# Altium footprint library Connectors.PcbLib: 268 footprints (part 7 of 21)
Each footprint in its own frame and in the unit in brackets; x right, y up, seen from the top. Pads: shape width x height; smd on the part's side, far side on the other; paste and mask are expansions set on the pad; w line width, h text height; cw(c..) or ccw(c..) is an arc to the next point about the centre after c.
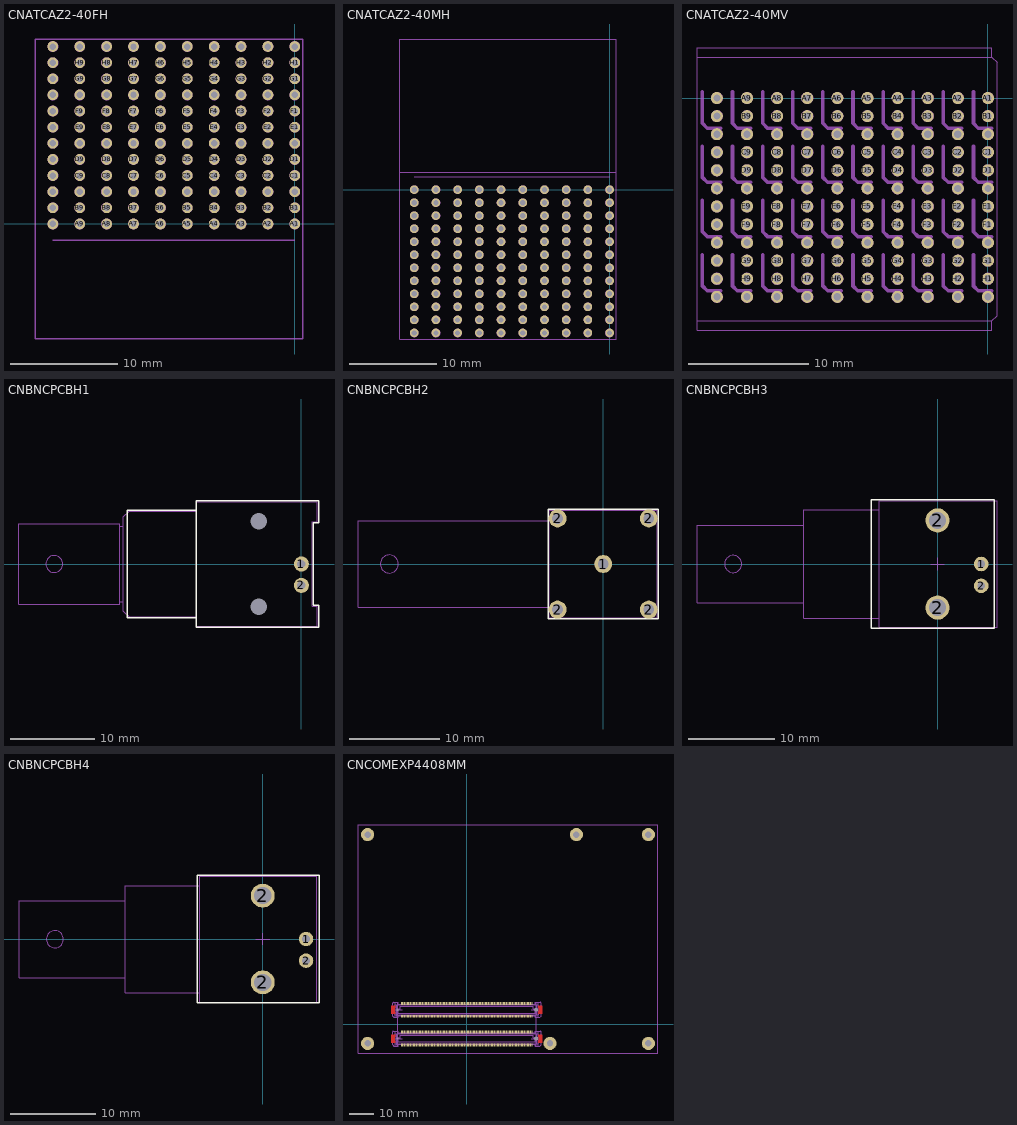
[diagram p6: the footprints below, top view; thin cyan lines are the x and y axes]

## CNATCAZ2-40FH [mm] "ATCA Zone 2 40 shielded pairs female horizontal daughterboard"
pads (120):
  round 1 hole 0.6: A1(0,0) A2(-2.5,0) A3(-5,0) A4(-7.5,0) A5(-10,0) A6(-12.5,0) A7(-15,0) A8(-17.5,0) A9(-20,0) A10(-22.5,0) B1(0,1.5) B2(-2.5,1.5) B3(-5,1.5) B4(-7.5,1.5) B5(-10,1.5) B6(-12.5,1.5) B7(-15,1.5) B8(-17.5,1.5) B9(-20,1.5) B10(-22.5,1.5) BG1(0,3) BG2(-2.5,3) BG3(-5,3) BG4(-7.5,3) BG5(-10,3) BG6(-12.5,3) BG7(-15,3) BG8(-17.5,3) BG9(-20,3) BG10(-22.5,3) C1(0,4.5) C2(-2.5,4.5) C3(-5,4.5) C4(-7.5,4.5) C5(-10,4.5) C6(-12.5,4.5) C7(-15,4.5) C8(-17.5,4.5) C9(-20,4.5) C10(-22.5,4.5) D1(0,6) D2(-2.5,6) D3(-5,6) D4(-7.5,6) D5(-10,6) D6(-12.5,6) D7(-15,6) D8(-17.5,6) D9(-20,6) D10(-22.5,6) DG1(0,7.5) DG2(-2.5,7.5) DG3(-5,7.5) DG4(-7.5,7.5) DG5(-10,7.5) DG6(-12.5,7.5) DG7(-15,7.5) DG8(-17.5,7.5) DG9(-20,7.5) DG10(-22.5,7.5) E1(0,9) E2(-2.5,9) E3(-5,9) E4(-7.5,9) E5(-10,9) E6(-12.5,9) E7(-15,9) E8(-17.5,9) E9(-20,9) E10(-22.5,9) F1(0,10.5) F2(-2.5,10.5) F3(-5,10.5) F4(-7.5,10.5) F5(-10,10.5) F6(-12.5,10.5) F7(-15,10.5) F8(-17.5,10.5) F9(-20,10.5) F10(-22.5,10.5) FG1(0,12) FG2(-2.5,12) FG3(-5,12) FG4(-7.5,12) FG5(-10,12) FG6(-12.5,12) FG7(-15,12) FG8(-17.5,12) FG9(-20,12) FG10(-22.5,12) G1(0,13.5) G2(-2.5,13.5) G3(-5,13.5) G4(-7.5,13.5) G5(-10,13.5) G6(-12.5,13.5) G7(-15,13.5) G8(-17.5,13.5) G9(-20,13.5) G10(-22.5,13.5) H1(0,15) H2(-2.5,15) H3(-5,15) H4(-7.5,15) H5(-10,15) H6(-12.5,15) H7(-15,15) H8(-17.5,15) H9(-20,15) H10(-22.5,15) HG1(0,16.5) HG2(-2.5,16.5) HG3(-5,16.5) HG4(-7.5,16.5) HG5(-10,16.5) HG6(-12.5,16.5) HG7(-15,16.5) HG8(-17.5,16.5) HG9(-20,16.5) HG10(-22.5,16.5)
Mechanical 13:
  lines w0.127: -24.15,-10.7 0.75,-10.7 0.75,17.2 -24.15,17.2 -24.15,-10.7
Mechanical 15:
  lines w0.127: -22.5,-1.5 0,-1.5
  text "DAUGHTER BOARD" at -16.7,-1.2 h0.8
Mechanical 16:
  circle w1: c-22.5,0 r0.001
  circle w1: c0,0 r0.001
  circle w1: c-10,0 r0.001
  circle w1: c-7.5,0 r0.001
  circle w1: c-5,0 r0.001
  circle w1: c-2.5,0 r0.001
  circle w1: c-12.5,0 r0.001
  circle w1: c-15,0 r0.001
  circle w1: c-17.5,0 r0.001
  circle w1: c-20,0 r0.001
  circle w1: c-22.5,1.5 r0.001
  circle w1: c0,1.5 r0.001
  circle w1: c-10,1.5 r0.001
  circle w1: c-7.5,1.5 r0.001
  circle w1: c-5,1.5 r0.001
  circle w1: c-2.5,1.5 r0.001
  circle w1: c-12.5,1.5 r0.001
  circle w1: c-15,1.5 r0.001
  circle w1: c-17.5,1.5 r0.001
  circle w1: c-20,1.5 r0.001
  circle w1: c-22.5,3 r0.001
  circle w1: c0,3 r0.001
  circle w1: c-10,3 r0.001
  circle w1: c-7.5,3 r0.001
  circle w1: c-5,3 r0.001
  circle w1: c-2.5,3 r0.001
  circle w1: c-12.5,3 r0.001
  circle w1: c-15,3 r0.001
  circle w1: c-17.5,3 r0.001
  circle w1: c-20,3 r0.001
  circle w1: c-22.5,4.5 r0.001
  circle w1: c0,4.5 r0.001
  circle w1: c-10,4.5 r0.001
  circle w1: c-7.5,4.5 r0.001
  circle w1: c-5,4.5 r0.001
  circle w1: c-2.5,4.5 r0.001
  circle w1: c-12.5,4.5 r0.001
  circle w1: c-15,4.5 r0.001
  circle w1: c-17.5,4.5 r0.001
  circle w1: c-20,4.5 r0.001
  circle w1: c-22.5,6 r0.001
  circle w1: c0,6 r0.001
  circle w1: c-10,6 r0.001
  circle w1: c-7.5,6 r0.001
  circle w1: c-5,6 r0.001
  circle w1: c-2.5,6 r0.001
  circle w1: c-12.5,6 r0.001
  circle w1: c-15,6 r0.001
  circle w1: c-17.5,6 r0.001
  circle w1: c-20,6 r0.001
  circle w1: c-22.5,7.5 r0.001
  circle w1: c0,7.5 r0.001
  circle w1: c-10,7.5 r0.001
  circle w1: c-7.5,7.5 r0.001
  circle w1: c-5,7.5 r0.001
  circle w1: c-2.5,7.5 r0.001
  circle w1: c-12.5,7.5 r0.001
  circle w1: c-15,7.5 r0.001
  circle w1: c-17.5,7.5 r0.001
  circle w1: c-20,7.5 r0.001
  circle w1: c-22.5,9 r0.001
  circle w1: c0,9 r0.001
  circle w1: c-10,9 r0.001
  circle w1: c-7.5,9 r0.001
  circle w1: c-5,9 r0.001
  circle w1: c-2.5,9 r0.001
  circle w1: c-12.5,9 r0.001
  circle w1: c-15,9 r0.001
  circle w1: c-17.5,9 r0.001
  circle w1: c-20,9 r0.001
  circle w1: c-22.5,10.5 r0.001
  circle w1: c0,10.5 r0.001
  circle w1: c-10,10.5 r0.001
  circle w1: c-7.5,10.5 r0.001
  circle w1: c-5,10.5 r0.001
  circle w1: c-2.5,10.5 r0.001
  circle w1: c-12.5,10.5 r0.001
  circle w1: c-15,10.5 r0.001
  circle w1: c-17.5,10.5 r0.001
  circle w1: c-20,10.5 r0.001
  circle w1: c-22.5,12 r0.001
  circle w1: c0,12 r0.001
  circle w1: c-10,12 r0.001
  circle w1: c-7.5,12 r0.001
  circle w1: c-5,12 r0.001
  circle w1: c-2.5,12 r0.001
  circle w1: c-12.5,12 r0.001
  circle w1: c-15,12 r0.001
  circle w1: c-17.5,12 r0.001
  circle w1: c-20,12 r0.001
  circle w1: c-22.5,13.5 r0.001
  circle w1: c0,13.5 r0.001
  circle w1: c-10,13.5 r0.001
  circle w1: c-7.5,13.5 r0.001
  circle w1: c-5,13.5 r0.001
  circle w1: c-2.5,13.5 r0.001
  circle w1: c-12.5,13.5 r0.001
  circle w1: c-15,13.5 r0.001
  circle w1: c-17.5,13.5 r0.001
  circle w1: c-20,13.5 r0.001
  circle w1: c-20,15 r0.001
  circle w1: c-17.5,15 r0.001
  circle w1: c-15,15 r0.001
  circle w1: c-12.5,15 r0.001
  circle w1: c-2.5,15 r0.001
  circle w1: c-5,15 r0.001
  circle w1: c-7.5,15 r0.001
  circle w1: c-10,15 r0.001
  circle w1: c0,15 r0.001
  circle w1: c0,16.5 r0.001
  circle w1: c-10,16.5 r0.001
  circle w1: c-7.5,16.5 r0.001
  circle w1: c-5,16.5 r0.001
  circle w1: c-2.5,16.5 r0.001
  circle w1: c-12.5,16.5 r0.001
  circle w1: c-15,16.5 r0.001
  circle w1: c-17.5,16.5 r0.001
  circle w1: c-22.5,15 r0.001
  circle w1: c-20,16.5 r0.001
  circle w1: c-22.5,16.5 r0.001
  text "Finished hole: 0.6 ± 0.05 mm" at 0.508,-1.905 h2.5
  text "Drilled hole: 0.7 ± 0.02 mm" at 0.508,-3.937 h2.5
3D body "c-6469081-01-o-3d.stp": height 12.19, standoff -4.66, extent -24.15,-10.7 0.75,13.7

## CNATCAZ2-40MH [mm] "ATCA Zone 2 40 shielded pairs male horizontal"
pads (120):
  round 1 hole 0.6: A1(0,0) A2(-2.5,0) A3(-5,0) A4(-7.5,0) A5(-10,0) A6(-12.5,0) A7(-15,0) A8(-17.5,0) A9(-20,0) A10(-22.5,0) B1(0,-1.5) B2(-2.5,-1.5) B3(-5,-1.5) B4(-7.5,-1.5) B5(-10,-1.5) B6(-12.5,-1.5) B7(-15,-1.5) B8(-17.5,-1.5) B9(-20,-1.5) B10(-22.5,-1.5) BG1(0,-3) BG2(-2.5,-3) BG3(-5,-3) BG4(-7.5,-3) BG5(-10,-3) BG6(-12.5,-3) BG7(-15,-3) BG8(-17.5,-3) BG9(-20,-3) BG10(-22.5,-3) C1(0,-4.5) C2(-2.5,-4.5) C3(-5,-4.5) C4(-7.5,-4.5) C5(-10,-4.5) C6(-12.5,-4.5) C7(-15,-4.5) C8(-17.5,-4.5) C9(-20,-4.5) C10(-22.5,-4.5) D1(0,-6) D2(-2.5,-6) D3(-5,-6) D4(-7.5,-6) D5(-10,-6) D6(-12.5,-6) D7(-15,-6) D8(-17.5,-6) D9(-20,-6) D10(-22.5,-6) DG1(0,-7.5) DG2(-2.5,-7.5) DG3(-5,-7.5) DG4(-7.5,-7.5) DG5(-10,-7.5) DG6(-12.5,-7.5) DG7(-15,-7.5) DG8(-17.5,-7.5) DG9(-20,-7.5) DG10(-22.5,-7.5) E1(0,-9) E2(-2.5,-9) E3(-5,-9) E4(-7.5,-9) E5(-10,-9) E6(-12.5,-9) E7(-15,-9) E8(-17.5,-9) E9(-20,-9) E10(-22.5,-9) F1(0,-10.5) F2(-2.5,-10.5) F3(-5,-10.5) F4(-7.5,-10.5) F5(-10,-10.5) F6(-12.5,-10.5) F7(-15,-10.5) F8(-17.5,-10.5) F9(-20,-10.5) F10(-22.5,-10.5) FG1(0,-12) FG2(-2.5,-12) FG3(-5,-12) FG4(-7.5,-12) FG5(-10,-12) FG6(-12.5,-12) FG7(-15,-12) FG8(-17.5,-12) FG9(-20,-12) FG10(-22.5,-12) G1(0,-13.5) G2(-2.5,-13.5) G3(-5,-13.5) G4(-7.5,-13.5) G5(-10,-13.5) G6(-12.5,-13.5) G7(-15,-13.5) G8(-17.5,-13.5) G9(-20,-13.5) G10(-22.5,-13.5) H1(0,-15) H2(-2.5,-15) H3(-5,-15) H4(-7.5,-15) H5(-10,-15) H6(-12.5,-15) H7(-15,-15) H8(-17.5,-15) H9(-20,-15) H10(-22.5,-15) HG1(0,-16.5) HG2(-2.5,-16.5) HG3(-5,-16.5) HG4(-7.5,-16.5) HG5(-10,-16.5) HG6(-12.5,-16.5) HG7(-15,-16.5) HG8(-17.5,-16.5) HG9(-20,-16.5) HG10(-22.5,-16.5)
Mechanical 13:
  lines w0.1: -24.15,2 0.75,2 ; 0.725,17.35 -24.15,17.35 -24.15,-17.2 0.75,-17.2 0.75,17.35
Mechanical 15:
  lines w0.1: -22.5,1.5 0,1.5
Mechanical 16:
  circle w1: c-22.5,-16.5 r0.001
  circle w1: c0,-16.5 r0.001
  circle w1: c-2.5,-16.5 r0.001
  circle w1: c-5,-16.5 r0.001
  circle w1: c-7.5,-16.5 r0.001
  circle w1: c-10,-16.5 r0.001
  circle w1: c-12.5,-16.5 r0.001
  circle w1: c-15,-16.5 r0.001
  circle w1: c-17.5,-16.5 r0.001
  circle w1: c-20,-16.5 r0.001
  circle w1: c-22.5,-15 r0.001
  circle w1: c0,-15 r0.001
  circle w1: c-2.5,-15 r0.001
  circle w1: c-5,-15 r0.001
  circle w1: c-7.5,-15 r0.001
  circle w1: c-10,-15 r0.001
  circle w1: c-12.5,-15 r0.001
  circle w1: c-15,-15 r0.001
  circle w1: c-17.5,-15 r0.001
  circle w1: c-20,-15 r0.001
  circle w1: c-22.5,-13.5 r0.001
  circle w1: c0,-13.5 r0.001
  circle w1: c-2.5,-13.5 r0.001
  circle w1: c-5,-13.5 r0.001
  circle w1: c-7.5,-13.5 r0.001
  circle w1: c-10,-13.5 r0.001
  circle w1: c-12.5,-13.5 r0.001
  circle w1: c-15,-13.5 r0.001
  circle w1: c-17.5,-13.5 r0.001
  circle w1: c-20,-13.5 r0.001
  circle w1: c-22.5,-12 r0.001
  circle w1: c0,-12 r0.001
  circle w1: c-2.5,-12 r0.001
  circle w1: c-5,-12 r0.001
  circle w1: c-7.5,-12 r0.001
  circle w1: c-10,-12 r0.001
  circle w1: c-12.5,-12 r0.001
  circle w1: c-15,-12 r0.001
  circle w1: c-17.5,-12 r0.001
  circle w1: c-20,-12 r0.001
  circle w1: c-22.5,-10.5 r0.001
  circle w1: c0,-10.5 r0.001
  circle w1: c-2.5,-10.5 r0.001
  circle w1: c-5,-10.5 r0.001
  circle w1: c-7.5,-10.5 r0.001
  circle w1: c-10,-10.5 r0.001
  circle w1: c-12.5,-10.5 r0.001
  circle w1: c-15,-10.5 r0.001
  circle w1: c-17.5,-10.5 r0.001
  circle w1: c-20,-10.5 r0.001
  circle w1: c-22.5,-9 r0.001
  circle w1: c0,-9 r0.001
  circle w1: c-2.5,-9 r0.001
  circle w1: c-5,-9 r0.001
  circle w1: c-7.5,-9 r0.001
  circle w1: c-10,-9 r0.001
  circle w1: c-12.5,-9 r0.001
  circle w1: c-15,-9 r0.001
  circle w1: c-17.5,-9 r0.001
  circle w1: c-20,-9 r0.001
  circle w1: c-22.5,-7.5 r0.001
  circle w1: c0,-7.5 r0.001
  circle w1: c-2.5,-7.5 r0.001
  circle w1: c-5,-7.5 r0.001
  circle w1: c-7.5,-7.5 r0.001
  circle w1: c-10,-7.5 r0.001
  circle w1: c-12.5,-7.5 r0.001
  circle w1: c-15,-7.5 r0.001
  circle w1: c-17.5,-7.5 r0.001
  circle w1: c-20,-7.5 r0.001
  circle w1: c-22.5,-6 r0.001
  circle w1: c0,-6 r0.001
  circle w1: c-2.5,-6 r0.001
  circle w1: c-5,-6 r0.001
  circle w1: c-7.5,-6 r0.001
  circle w1: c-10,-6 r0.001
  circle w1: c-12.5,-6 r0.001
  circle w1: c-15,-6 r0.001
  circle w1: c-17.5,-6 r0.001
  circle w1: c-20,-6 r0.001
  circle w1: c-22.5,-4.5 r0.001
  circle w1: c0,-4.5 r0.001
  circle w1: c-2.5,-4.5 r0.001
  circle w1: c-5,-4.5 r0.001
  circle w1: c-7.5,-4.5 r0.001
  circle w1: c-10,-4.5 r0.001
  circle w1: c-12.5,-4.5 r0.001
  circle w1: c-15,-4.5 r0.001
  circle w1: c-17.5,-4.5 r0.001
  circle w1: c-20,-4.5 r0.001
  circle w1: c-22.5,-3 r0.001
  circle w1: c0,-3 r0.001
  circle w1: c-2.5,-3 r0.001
  circle w1: c-5,-3 r0.001
  circle w1: c-7.5,-3 r0.001
  circle w1: c-10,-3 r0.001
  circle w1: c-12.5,-3 r0.001
  circle w1: c-15,-3 r0.001
  circle w1: c-17.5,-3 r0.001
  circle w1: c-20,-3 r0.001
  circle w1: c-20,-1.5 r0.001
  circle w1: c-17.5,-1.5 r0.001
  circle w1: c-15,-1.5 r0.001
  circle w1: c-12.5,-1.5 r0.001
  circle w1: c-10,-1.5 r0.001
  circle w1: c-7.5,-1.5 r0.001
  circle w1: c-5,-1.5 r0.001
  circle w1: c-2.5,-1.5 r0.001
  circle w1: c0,-1.5 r0.001
  circle w1: c0,0 r0.001
  circle w1: c-2.5,0 r0.001
  circle w1: c-5,0 r0.001
  circle w1: c-7.5,0 r0.001
  circle w1: c-10,0 r0.001
  circle w1: c-12.5,0 r0.001
  circle w1: c-15,0 r0.001
  circle w1: c-17.5,0 r0.001
  circle w1: c-22.5,0 r0.001
  circle w1: c-20,0 r0.001
  circle w1: c-22.5,-1.5 r0.001
  text "Drilled hole: 0.7 ± 0.02 mm" at -24.003,4.318 h2.5
  text "Finished hole: 0.6 ± 0.05 mm" at -24.003,2.286 h2.5
3D body "c-6469183-01-o-3d.stp": height 13.34, standoff -5.66, extent -24.15,-12.65 0.75,17.35

## CNATCAZ2-40MV [mm] "ATCA Zone 2 40 shielded pairs male vertical backplane"
pads (120):
  round 1 hole 0.6: A1(0,0) A2(-2.5,0) A3(-5,0) A4(-7.5,0) A5(-10,0) A6(-12.5,0) A7(-15,0) A8(-17.5,0) A9(-20,0) A10(-22.5,0) B1(0,-1.5) B2(-2.5,-1.5) B3(-5,-1.5) B4(-7.5,-1.5) B5(-10,-1.5) B6(-12.5,-1.5) B7(-15,-1.5) B8(-17.5,-1.5) B9(-20,-1.5) B10(-22.5,-1.5) BG1(0,-3) BG2(-2.5,-3) BG3(-5,-3) BG4(-7.5,-3) BG5(-10,-3) BG6(-12.5,-3) BG7(-15,-3) BG8(-17.5,-3) BG9(-20,-3) BG10(-22.5,-3) C1(0,-4.5) C2(-2.5,-4.5) C3(-5,-4.5) C4(-7.5,-4.5) C5(-10,-4.5) C6(-12.5,-4.5) C7(-15,-4.5) C8(-17.5,-4.5) C9(-20,-4.5) C10(-22.5,-4.5) D1(0,-6) D2(-2.5,-6) D3(-5,-6) D4(-7.5,-6) D5(-10,-6) D6(-12.5,-6) D7(-15,-6) D8(-17.5,-6) D9(-20,-6) D10(-22.5,-6) DG1(0,-7.5) DG2(-2.5,-7.5) DG3(-5,-7.5) DG4(-7.5,-7.5) DG5(-10,-7.5) DG6(-12.5,-7.5) DG7(-15,-7.5) DG8(-17.5,-7.5) DG9(-20,-7.5) DG10(-22.5,-7.5) E1(0,-9) E2(-2.5,-9) E3(-5,-9) E4(-7.5,-9) E5(-10,-9) E6(-12.5,-9) E7(-15,-9) E8(-17.5,-9) E9(-20,-9) E10(-22.5,-9) F1(0,-10.5) F2(-2.5,-10.5) F3(-5,-10.5) F4(-7.5,-10.5) F5(-10,-10.5) F6(-12.5,-10.5) F7(-15,-10.5) F8(-17.5,-10.5) F9(-20,-10.5) F10(-22.5,-10.5) FG1(0,-12) FG2(-2.5,-12) FG3(-5,-12) FG4(-7.5,-12) FG5(-10,-12) FG6(-12.5,-12) FG7(-15,-12) FG8(-17.5,-12) FG9(-20,-12) FG10(-22.5,-12) G1(0,-13.5) G2(-2.5,-13.5) G3(-5,-13.5) G4(-7.5,-13.5) G5(-10,-13.5) G6(-12.5,-13.5) G7(-15,-13.5) G8(-17.5,-13.5) G9(-20,-13.5) G10(-22.5,-13.5) H1(0,-15) H2(-2.5,-15) H3(-5,-15) H4(-7.5,-15) H5(-10,-15) H6(-12.5,-15) H7(-15,-15) H8(-17.5,-15) H9(-20,-15) H10(-22.5,-15) HG1(0,-16.5) HG2(-2.5,-16.5) HG3(-5,-16.5) HG4(-7.5,-16.5) HG5(-10,-16.5) HG6(-12.5,-16.5) HG7(-15,-16.5) HG8(-17.5,-16.5) HG9(-20,-16.5) HG10(-22.5,-16.5)
Mechanical 13:
  lines w0.1: -24.15,-18.5 0.3,-18.5 ; -24.15,3.4 0.3,3.4 ; 0.3,-18.5 0.3,-19.265 -24.15,-19.265 -24.15,4.165 0.3,4.165 0.3,3.4 ; 0.3,-18.5 0.75,-18.05 0.75,2.95 0.3,3.4
  lines w0.3: -23.7,-13 -23.7,-15.6 -23.3,-16 -22.2,-16 ; -23.7,-8.5 -23.7,-11.1 -23.3,-11.5 -22.2,-11.5 ; -23.7,-4 -23.7,-6.6 -23.3,-7 -22.2,-7 ; -23.7,0.5 -23.7,-2.1 -23.3,-2.5 -22.2,-2.5 ; -21.2,-13 -21.2,-15.6 -20.8,-16 -19.7,-16 ; -21.2,-8.5 -21.2,-11.1 -20.8,-11.5 -19.7,-11.5 ; -21.2,-4 -21.2,-6.6 -20.8,-7 -19.7,-7 ; -21.2,0.5 -21.2,-2.1 -20.8,-2.5 -19.7,-2.5 ; -18.7,-13 -18.7,-15.6 -18.3,-16 -17.2,-16 ; -18.7,-8.5 -18.7,-11.1 -18.3,-11.5 -17.2,-11.5 ; -18.7,-4 -18.7,-6.6 -18.3,-7 -17.2,-7 ; -18.7,0.5 -18.7,-2.1 -18.3,-2.5 -17.2,-2.5 ; -16.2,-13 -16.2,-15.6 -15.8,-16 -14.7,-16 ; -16.2,-8.5 -16.2,-11.1 -15.8,-11.5 -14.7,-11.5 ; -16.2,-4 -16.2,-6.6 -15.8,-7 -14.7,-7 ; -16.2,0.5 -16.2,-2.1 -15.8,-2.5 -14.7,-2.5 ; -13.7,-13 -13.7,-15.6 -13.3,-16 -12.2,-16 ; -13.7,-8.5 -13.7,-11.1 -13.3,-11.5 -12.2,-11.5 ; -13.7,-4 -13.7,-6.6 -13.3,-7 -12.2,-7 ; -13.7,0.5 -13.7,-2.1 -13.3,-2.5 -12.2,-2.5 ; -11.2,-13 -11.2,-15.6 -10.8,-16 -9.7,-16 ; -11.2,-8.5 -11.2,-11.1 -10.8,-11.5 -9.7,-11.5 ; -11.2,-4 -11.2,-6.6 -10.8,-7 -9.7,-7 ; -11.2,0.5 -11.2,-2.1 -10.8,-2.5 -9.7,-2.5 ; -8.7,-13 -8.7,-15.6 -8.3,-16 -7.2,-16 ; -8.7,-8.5 -8.7,-11.1 -8.3,-11.5 -7.2,-11.5 ; -8.7,-4 -8.7,-6.6 -8.3,-7 -7.2,-7 ; -8.7,0.5 -8.7,-2.1 -8.3,-2.5 -7.2,-2.5 ; -6.2,-13 -6.2,-15.6 -5.8,-16 -4.7,-16 ; -6.2,-8.5 -6.2,-11.1 -5.8,-11.5 -4.7,-11.5 ; -6.2,-4 -6.2,-6.6 -5.8,-7 -4.7,-7 ; -6.2,0.5 -6.2,-2.1 -5.8,-2.5 -4.7,-2.5 ; -3.7,-13 -3.7,-15.6 -3.3,-16 -2.2,-16 ; -3.7,-8.5 -3.7,-11.1 -3.3,-11.5 -2.2,-11.5 ; -3.7,-4 -3.7,-6.6 -3.3,-7 -2.2,-7 ; -3.7,0.5 -3.7,-2.1 -3.3,-2.5 -2.2,-2.5 ; -1.2,-13 -1.2,-15.6 -0.8,-16 0.3,-16 ; -1.2,-8.5 -1.2,-11.1 -0.8,-11.5 0.3,-11.5 ; -1.2,-4 -1.2,-6.6 -0.8,-7 0.3,-7 ; -1.2,0.5 -1.2,-2.1 -0.8,-2.5 0.3,-2.5
Mechanical 16:
  circle w1: c-22.5,-1.5 r0.001
  circle w1: c-20,0 r0.001
  circle w1: c-22.5,0 r0.001
  circle w1: c-17.5,0 r0.001
  circle w1: c-15,0 r0.001
  circle w1: c-12.5,0 r0.001
  circle w1: c-10,0 r0.001
  circle w1: c-7.5,0 r0.001
  circle w1: c-5,0 r0.001
  circle w1: c-2.5,0 r0.001
  circle w1: c0,0 r0.001
  circle w1: c0,-1.5 r0.001
  circle w1: c-2.5,-1.5 r0.001
  circle w1: c-5,-1.5 r0.001
  circle w1: c-7.5,-1.5 r0.001
  circle w1: c-10,-1.5 r0.001
  circle w1: c-12.5,-1.5 r0.001
  circle w1: c-15,-1.5 r0.001
  circle w1: c-17.5,-1.5 r0.001
  circle w1: c-20,-1.5 r0.001
  circle w1: c-20,-3 r0.001
  circle w1: c-17.5,-3 r0.001
  circle w1: c-15,-3 r0.001
  circle w1: c-12.5,-3 r0.001
  circle w1: c-10,-3 r0.001
  circle w1: c-7.5,-3 r0.001
  circle w1: c-5,-3 r0.001
  circle w1: c-2.5,-3 r0.001
  circle w1: c0,-3 r0.001
  circle w1: c-22.5,-3 r0.001
  circle w1: c-20,-4.5 r0.001
  circle w1: c-17.5,-4.5 r0.001
  circle w1: c-15,-4.5 r0.001
  circle w1: c-12.5,-4.5 r0.001
  circle w1: c-10,-4.5 r0.001
  circle w1: c-7.5,-4.5 r0.001
  circle w1: c-5,-4.5 r0.001
  circle w1: c-2.5,-4.5 r0.001
  circle w1: c0,-4.5 r0.001
  circle w1: c-22.5,-4.5 r0.001
  circle w1: c-20,-6 r0.001
  circle w1: c-17.5,-6 r0.001
  circle w1: c-15,-6 r0.001
  circle w1: c-12.5,-6 r0.001
  circle w1: c-10,-6 r0.001
  circle w1: c-7.5,-6 r0.001
  circle w1: c-5,-6 r0.001
  circle w1: c-2.5,-6 r0.001
  circle w1: c0,-6 r0.001
  circle w1: c-22.5,-6 r0.001
  circle w1: c-20,-7.5 r0.001
  circle w1: c-17.5,-7.5 r0.001
  circle w1: c-15,-7.5 r0.001
  circle w1: c-12.5,-7.5 r0.001
  circle w1: c-10,-7.5 r0.001
  circle w1: c-7.5,-7.5 r0.001
  circle w1: c-5,-7.5 r0.001
  circle w1: c-2.5,-7.5 r0.001
  circle w1: c0,-7.5 r0.001
  circle w1: c-22.5,-7.5 r0.001
  circle w1: c-20,-9 r0.001
  circle w1: c-17.5,-9 r0.001
  circle w1: c-15,-9 r0.001
  circle w1: c-12.5,-9 r0.001
  circle w1: c-10,-9 r0.001
  circle w1: c-7.5,-9 r0.001
  circle w1: c-5,-9 r0.001
  circle w1: c-2.5,-9 r0.001
  circle w1: c0,-9 r0.001
  circle w1: c-22.5,-9 r0.001
  circle w1: c-20,-10.5 r0.001
  circle w1: c-17.5,-10.5 r0.001
  circle w1: c-15,-10.5 r0.001
  circle w1: c-12.5,-10.5 r0.001
  circle w1: c-10,-10.5 r0.001
  circle w1: c-7.5,-10.5 r0.001
  circle w1: c-5,-10.5 r0.001
  circle w1: c-2.5,-10.5 r0.001
  circle w1: c0,-10.5 r0.001
  circle w1: c-22.5,-10.5 r0.001
  circle w1: c-20,-12 r0.001
  circle w1: c-17.5,-12 r0.001
  circle w1: c-15,-12 r0.001
  circle w1: c-12.5,-12 r0.001
  circle w1: c-10,-12 r0.001
  circle w1: c-7.5,-12 r0.001
  circle w1: c-5,-12 r0.001
  circle w1: c-2.5,-12 r0.001
  circle w1: c0,-12 r0.001
  circle w1: c-22.5,-12 r0.001
  circle w1: c-20,-13.5 r0.001
  circle w1: c-17.5,-13.5 r0.001
  circle w1: c-15,-13.5 r0.001
  circle w1: c-12.5,-13.5 r0.001
  circle w1: c-10,-13.5 r0.001
  circle w1: c-7.5,-13.5 r0.001
  circle w1: c-5,-13.5 r0.001
  circle w1: c-2.5,-13.5 r0.001
  circle w1: c0,-13.5 r0.001
  circle w1: c-22.5,-13.5 r0.001
  circle w1: c-20,-15 r0.001
  circle w1: c-17.5,-15 r0.001
  circle w1: c-15,-15 r0.001
  circle w1: c-12.5,-15 r0.001
  circle w1: c-10,-15 r0.001
  circle w1: c-7.5,-15 r0.001
  circle w1: c-5,-15 r0.001
  circle w1: c-2.5,-15 r0.001
  circle w1: c0,-15 r0.001
  circle w1: c-22.5,-15 r0.001
  circle w1: c-20,-16.5 r0.001
  circle w1: c-17.5,-16.5 r0.001
  circle w1: c-15,-16.5 r0.001
  circle w1: c-12.5,-16.5 r0.001
  circle w1: c-10,-16.5 r0.001
  circle w1: c-7.5,-16.5 r0.001
  circle w1: c-5,-16.5 r0.001
  circle w1: c-2.5,-16.5 r0.001
  circle w1: c0,-16.5 r0.001
  circle w1: c-22.5,-16.5 r0.001
  text "Finished hole: 0.6 ± 0.05 mm" at -24.003,2.286 h2.5
  text "Drilled hole: 0.7 ± 0.02 mm" at -24.003,4.318 h2.5
3D body: height 9.3, standoff 0, extent -23.851,-16.167 -22.047,-12.84
3D body: height 9.3, standoff 0, extent -21.351,-16.167 -19.547,-12.84
3D body: height 9.3, standoff 0, extent -18.851,-16.167 -17.047,-12.84
3D body: height 9.3, standoff 0, extent -16.351,-16.167 -14.547,-12.84
3D body: height 9.3, standoff 0, extent -13.851,-16.167 -12.047,-12.84
3D body: height 9.3, standoff 0, extent -11.351,-16.167 -9.547,-12.84
3D body: height 9.3, standoff 0, extent -8.851,-16.167 -7.047,-12.84
3D body: height 9.3, standoff 0, extent -6.351,-16.167 -4.547,-12.84
3D body: height 9.3, standoff 0, extent -3.851,-16.167 -2.047,-12.84
3D body: height 9.3, standoff 0, extent -1.351,-16.167 0.453,-12.84
3D body: height 9.3, standoff 0, extent -1.351,-11.667 0.453,-8.34
3D body: height 9.3, standoff 0, extent -3.851,-11.667 -2.047,-8.34
3D body: height 9.3, standoff 0, extent -6.351,-11.667 -4.547,-8.34
3D body: height 9.3, standoff 0, extent -8.851,-11.667 -7.047,-8.34
3D body: height 9.3, standoff 0, extent -11.351,-11.667 -9.547,-8.34
3D body: height 9.3, standoff 0, extent -13.851,-11.667 -12.047,-8.34
3D body: height 9.3, standoff 0, extent -16.351,-11.667 -14.547,-8.34
3D body: height 9.3, standoff 0, extent -18.851,-11.667 -17.047,-8.34
3D body: height 9.3, standoff 0, extent -21.351,-11.667 -19.547,-8.34
3D body: height 9.3, standoff 0, extent -23.851,-11.667 -22.047,-8.34
3D body: height 9.3, standoff 0, extent -23.851,-7.167 -22.047,-3.84
3D body: height 9.3, standoff 0, extent -21.351,-7.167 -19.547,-3.84
3D body: height 9.3, standoff 0, extent -18.851,-7.167 -17.047,-3.84
3D body: height 9.3, standoff 0, extent -16.351,-7.167 -14.547,-3.84
3D body: height 9.3, standoff 0, extent -13.851,-7.167 -12.047,-3.84
3D body: height 9.3, standoff 0, extent -11.351,-7.167 -9.547,-3.84
3D body: height 9.3, standoff 0, extent -8.851,-7.167 -7.047,-3.84
3D body: height 9.3, standoff 0, extent -6.351,-7.167 -4.547,-3.84
3D body: height 9.3, standoff 0, extent -3.851,-7.167 -2.047,-3.84
3D body: height 9.3, standoff 0, extent -1.351,-7.167 0.453,-3.84
3D body: height 9.3, standoff 0, extent -1.351,-2.667 0.453,0.66
3D body: height 9.3, standoff 0, extent -3.851,-2.667 -2.047,0.66
3D body: height 9.3, standoff 0, extent -6.351,-2.667 -4.547,0.66
3D body: height 9.3, standoff 0, extent -8.851,-2.667 -7.047,0.66
3D body: height 9.3, standoff 0, extent -11.351,-2.667 -9.547,0.66
3D body: height 9.3, standoff 0, extent -13.851,-2.667 -12.047,0.66
3D body: height 9.3, standoff 0, extent -16.351,-2.667 -14.547,0.66
3D body: height 9.3, standoff 0, extent -18.851,-2.667 -17.047,0.66
3D body: height 9.3, standoff 0, extent -21.351,-2.667 -19.547,0.66
3D body: height 9.3, standoff 0, extent -23.851,-2.667 -22.047,0.66
3D body: height 8.25, standoff -2.5, extent -0.258,-13.703 0.25,-13.322